# Altium schematic symbol library jlcpcb_2025_04_capacitors_extended_0603.schlib: 3668 symbols (part 6 of 20) (continued)
## 06035C333JAT2A
designator C?  Capacitance: 33nF  (hidden comment: *)
Capacitor, Ceramic (MLCC), 33nF, ±5%, 50V, X7R, ±5%, SMD 0603; Manufacturer: Kyocera AVX; Manufacturer Part Number: 06035C333JAT2A; Package Size: 0603; JLCPCB Basic Part: No; JLCPCB Part Number: C2167207; Supplier 1: LCSC; Category: Capacitors - MLCC; Supplier Part Number 1: C2167207; Tolerance: ±5%; Voltage Rating: 50V; Temperature Coefficient: X7R; RoHS: Yes; ComponentLink1Description: Datasheet; ComponentLink1URL: https://wmsc.lcsc.com/wmsc/upload/file/pdf/v2/lcsc/2304140030_Kyocera-AVX-06035C333JAT2A_C2167207.pdf; ComponentLink2Description: JLCPCB Part URL; ComponentLink2URL: https://jlcpcb.com/partdetail/C2167207; ComponentLink3Description: LCSC Part URL; ComponentLink3URL: https://lcsc.com/product-detail/Multilayer-Ceramic-Capacitors-MLCC---SMD-SMT_Kyocera-AVX-Kyocera-AVX-06035C333JAT2A_C2167207.html
footprint CAP-0603 (0603 (1608M) Capacitor)
pins: 1, 2

## 06035C392KAT2A
designator C?  Capacitance: 3.9nF  (hidden comment: *)
Capacitor, Ceramic (MLCC), 3.9nF, ±10%, 50V, X7R, ±10%, SMD 0603; Manufacturer: Kyocera AVX; Manufacturer Part Number: 06035C392KAT2A; Package Size: 0603; JLCPCB Basic Part: No; JLCPCB Part Number: C2169862; Supplier 1: LCSC; Category: Capacitors - MLCC; Supplier Part Number 1: C2169862; Tolerance: ±10%; Voltage Rating: 50V; Temperature Coefficient: X7R; RoHS: Yes; ComponentLink1Description: Datasheet; ComponentLink1URL: https://wmsc.lcsc.com/wmsc/upload/file/pdf/v2/lcsc/2304140030_Kyocera-AVX-06035C392KAT2A_C2169862.pdf; ComponentLink2Description: JLCPCB Part URL; ComponentLink2URL: https://jlcpcb.com/partdetail/C2169862; ComponentLink3Description: LCSC Part URL; ComponentLink3URL: https://lcsc.com/product-detail/Multilayer-Ceramic-Capacitors-MLCC---SMD-SMT_Kyocera-AVX-Kyocera-AVX-06035C392KAT2A_C2169862.html
footprint CAP-0603 (0603 (1608M) Capacitor)
pins: 1, 2

## 06035C471K4T2A
designator C?  Capacitance: 470pF  (hidden comment: *)
Capacitor, Ceramic (MLCC), 470pF, ±10%, 50V, X7R, ±10%, SMD 0603; Manufacturer: Kyocera AVX; Manufacturer Part Number: 06035C471K4T2A; Package Size: 0603; JLCPCB Basic Part: No; JLCPCB Part Number: C597213; Supplier 1: LCSC; Category: Capacitors - MLCC; Supplier Part Number 1: C597213; Tolerance: ±10%; Voltage Rating: 50V; Temperature Coefficient: X7R; RoHS: Yes; ComponentLink1Description: Datasheet; ComponentLink1URL: https://wmsc.lcsc.com/wmsc/upload/file/pdf/v2/lcsc/2309151023_Kyocera-AVX-06035C471K4T2A_C597213.pdf; ComponentLink2Description: JLCPCB Part URL; ComponentLink2URL: https://jlcpcb.com/partdetail/C597213; ComponentLink3Description: LCSC Part URL; ComponentLink3URL: https://lcsc.com/product-detail/Multilayer-Ceramic-Capacitors-MLCC---SMD-SMT_Kyocera-AVX-Kyocera-AVX-06035C471K4T2A_C597213.html
footprint CAP-0603 (0603 (1608M) Capacitor)
pins: 1, 2

## 06035C472K4T2A
designator C?  Capacitance: 4.7nF  (hidden comment: *)
Capacitor, Ceramic (MLCC), 4.7nF, ±10%, 50V, X7R, ±10%, SMD 0603; Manufacturer: AVX; Manufacturer Part Number: 06035C472K4T2A; Package Size: 0603; JLCPCB Basic Part: No; JLCPCB Part Number: C597214; Supplier 1: LCSC; Category: Capacitors - MLCC; Supplier Part Number 1: C597214; Tolerance: ±10%; Voltage Rating: 50V; Temperature Coefficient: X7R; RoHS: Yes; ComponentLink1Description: Datasheet; ComponentLink1URL: https://wmsc.lcsc.com/wmsc/upload/file/pdf/v2/lcsc/2304140030_Kyocera-AVX-06035C472K4T2A_C597214.pdf; ComponentLink2Description: JLCPCB Part URL; ComponentLink2URL: https://jlcpcb.com/partdetail/C597214; ComponentLink3Description: LCSC Part URL; ComponentLink3URL: https://lcsc.com/product-detail/Multilayer-Ceramic-Capacitors-MLCC---SMD-SMT_Kyocera-AVX-Kyocera-AVX-06035C472K4T2A_C597214.html
footprint CAP-0603 (0603 (1608M) Capacitor)
pins: 1, 2

## 06035C472KAT2A
designator C?  Capacitance: 4.7nF  (hidden comment: *)
Capacitor, Ceramic (MLCC), 4.7nF, ±10%, 50V, X7R, ±10%, SMD 0603; Manufacturer: AVX; Manufacturer Part Number: 06035C472KAT2A; Package Size: 0603; JLCPCB Basic Part: No; JLCPCB Part Number: C513327; Supplier 1: LCSC; Category: Capacitors - MLCC; Supplier Part Number 1: C513327; Tolerance: ±10%; Voltage Rating: 50V; Temperature Coefficient: X7R; RoHS: Yes; ComponentLink1Description: Datasheet; ComponentLink1URL: https://wmsc.lcsc.com/wmsc/upload/file/pdf/v2/lcsc/2304140030_Kyocera-AVX-06035C472KAT2A_C513327.pdf; ComponentLink2Description: JLCPCB Part URL; ComponentLink2URL: https://jlcpcb.com/partdetail/C513327; ComponentLink3Description: LCSC Part URL; ComponentLink3URL: https://lcsc.com/product-detail/Multilayer-Ceramic-Capacitors-MLCC---SMD-SMT_Kyocera-AVX-Kyocera-AVX-06035C472KAT2A_C513327.html
footprint CAP-0603 (0603 (1608M) Capacitor)
pins: 1, 2

## 06035C473K4T2A
designator C?  Capacitance: 47nF  (hidden comment: *)
Capacitor, Ceramic (MLCC), 47nF, ±10%, 50V, X7R, ±10%, SMD 0603; Manufacturer: AVX; Manufacturer Part Number: 06035C473K4T2A; Package Size: 0603; JLCPCB Basic Part: No; JLCPCB Part Number: C597217; Supplier 1: LCSC; Category: Capacitors - MLCC; Supplier Part Number 1: C597217; Tolerance: ±10%; Voltage Rating: 50V; Temperature Coefficient: X7R; RoHS: Yes; ComponentLink1Description: Datasheet; ComponentLink1URL: https://wmsc.lcsc.com/wmsc/upload/file/pdf/v2/lcsc/2304140030_Kyocera-AVX-06035C473K4T2A_C597217.pdf; ComponentLink2Description: JLCPCB Part URL; ComponentLink2URL: https://jlcpcb.com/partdetail/C597217; ComponentLink3Description: LCSC Part URL; ComponentLink3URL: https://lcsc.com/product-detail/Multilayer-Ceramic-Capacitors-MLCC---SMD-SMT_Kyocera-AVX-Kyocera-AVX-06035C473K4T2A_C597217.html
footprint CAP-0603 (0603 (1608M) Capacitor)
pins: 1, 2

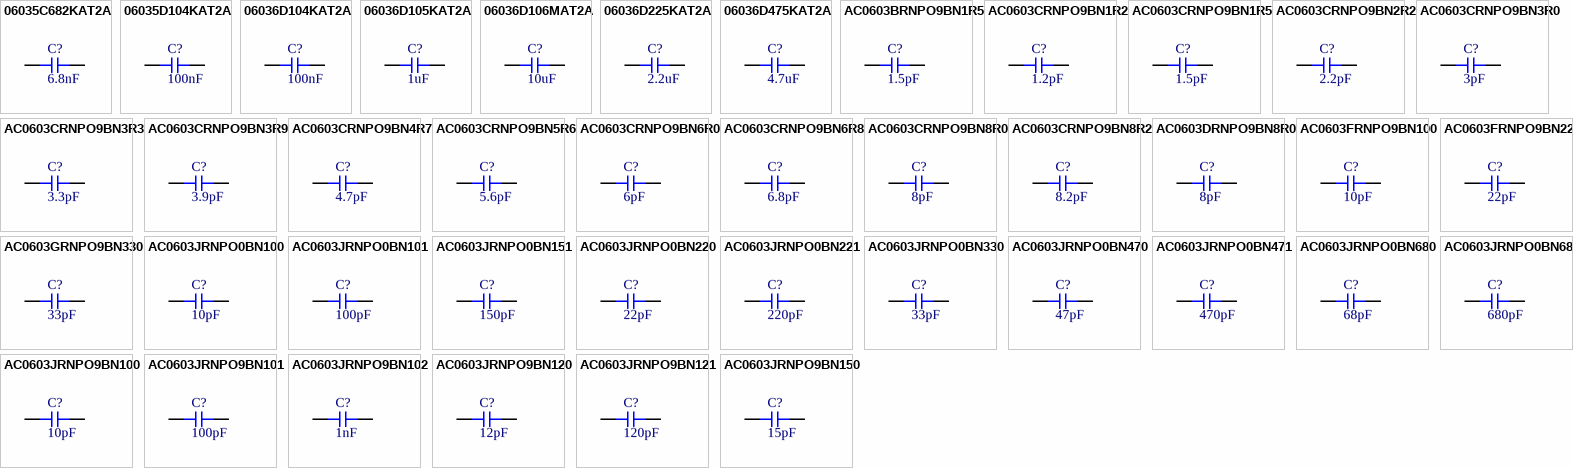
[diagram p24: symbols 06035C682KAT2A to AC0603JRNPO9BN150]

## 06035C682KAT2A
designator C?  Capacitance: 6.8nF  (hidden comment: *)
Capacitor, Ceramic (MLCC), 6.8nF, ±10%, 50V, X7R, ±10%, SMD 0603; Manufacturer: AVX; Manufacturer Part Number: 06035C682KAT2A; Package Size: 0603; JLCPCB Basic Part: No; JLCPCB Part Number: C597224; Supplier 1: LCSC; Category: Capacitors - MLCC; Supplier Part Number 1: C597224; Tolerance: ±10%; Voltage Rating: 50V; Temperature Coefficient: X7R; RoHS: Yes; ComponentLink1Description: Datasheet; ComponentLink1URL: https://wmsc.lcsc.com/wmsc/upload/file/pdf/v2/lcsc/2304140030_Kyocera-AVX-06035C682KAT2A_C597224.pdf; ComponentLink2Description: JLCPCB Part URL; ComponentLink2URL: https://jlcpcb.com/partdetail/C597224; ComponentLink3Description: LCSC Part URL; ComponentLink3URL: https://lcsc.com/product-detail/Multilayer-Ceramic-Capacitors-MLCC---SMD-SMT_Kyocera-AVX-Kyocera-AVX-06035C682KAT2A_C597224.html
footprint CAP-0603 (0603 (1608M) Capacitor)
pins: 1, 2

## 06035D104KAT2A
designator C?  Capacitance: 100nF  (hidden comment: *)
Capacitor, Ceramic (MLCC), 100nF, ±10%, 50V, X5R, ±10%, SMD 0603; Manufacturer: AVX; Manufacturer Part Number: 06035D104KAT2A; Package Size: 0603; JLCPCB Basic Part: No; JLCPCB Part Number: C597227; Supplier 1: LCSC; Category: Capacitors - MLCC; Supplier Part Number 1: C597227; Tolerance: ±10%; Voltage Rating: 50V; Temperature Coefficient: X5R; RoHS: Yes; ComponentLink1Description: Datasheet; ComponentLink1URL: https://wmsc.lcsc.com/wmsc/upload/file/pdf/v2/lcsc/2304140030_Kyocera-AVX-06035D104KAT2A_C597227.pdf; ComponentLink2Description: JLCPCB Part URL; ComponentLink2URL: https://jlcpcb.com/partdetail/C597227; ComponentLink3Description: LCSC Part URL; ComponentLink3URL: https://lcsc.com/product-detail/Multilayer-Ceramic-Capacitors-MLCC---SMD-SMT_Kyocera-AVX-Kyocera-AVX-06035D104KAT2A_C597227.html
footprint CAP-0603 (0603 (1608M) Capacitor)
pins: 1, 2

## 06036D104KAT2A
designator C?  Capacitance: 100nF  (hidden comment: *)
Capacitor, Ceramic (MLCC), 100nF, ±10%, 6.3V, X5R, ±10%, SMD 0603; Manufacturer: Kyocera AVX; Manufacturer Part Number: 06036D104KAT2A; Package Size: 0603; JLCPCB Basic Part: No; JLCPCB Part Number: C1856510; Supplier 1: LCSC; Category: Capacitors - MLCC; Supplier Part Number 1: C1856510; Tolerance: ±10%; Voltage Rating: 6.3V; Temperature Coefficient: X5R; RoHS: Yes; ComponentLink1Description: Datasheet; ComponentLink1URL: https://wmsc.lcsc.com/wmsc/upload/file/pdf/v2/lcsc/2304140030_Kyocera-AVX-06036D104KAT2A_C1856510.pdf; ComponentLink2Description: JLCPCB Part URL; ComponentLink2URL: https://jlcpcb.com/partdetail/C1856510; ComponentLink3Description: LCSC Part URL; ComponentLink3URL: https://lcsc.com/product-detail/Multilayer-Ceramic-Capacitors-MLCC---SMD-SMT_Kyocera-AVX-Kyocera-AVX-06036D104KAT2A_C1856510.html
footprint CAP-0603 (0603 (1608M) Capacitor)
pins: 1, 2

## 06036D105KAT2A
designator C?  Capacitance: 1uF  (hidden comment: *)
Capacitor, Ceramic (MLCC), 1uF, ±10%, 6.3V, X5R, ±10%, SMD 0603; Manufacturer: AVX; Manufacturer Part Number: 06036D105KAT2A; Package Size: 0603; JLCPCB Basic Part: No; JLCPCB Part Number: C597233; Supplier 1: LCSC; Category: Capacitors - MLCC; Supplier Part Number 1: C597233; Tolerance: ±10%; Voltage Rating: 6.3V; Temperature Coefficient: X5R; RoHS: Yes; ComponentLink1Description: Datasheet; ComponentLink1URL: https://wmsc.lcsc.com/wmsc/upload/file/pdf/v2/lcsc/2304140030_Kyocera-AVX-06036D105KAT2A_C597233.pdf; ComponentLink2Description: JLCPCB Part URL; ComponentLink2URL: https://jlcpcb.com/partdetail/C597233; ComponentLink3Description: LCSC Part URL; ComponentLink3URL: https://lcsc.com/product-detail/Multilayer-Ceramic-Capacitors-MLCC---SMD-SMT_Kyocera-AVX-Kyocera-AVX-06036D105KAT2A_C597233.html
footprint CAP-0603 (0603 (1608M) Capacitor)
pins: 1, 2

## 06036D106MAT2A
designator C?  Capacitance: 10uF  (hidden comment: *)
Capacitor, Ceramic (MLCC), 10uF, ±20%, 6.3V, X5R, ±20%, SMD 0603; Manufacturer: Kyocera AVX; Manufacturer Part Number: 06036D106MAT2A; Package Size: 0603; JLCPCB Basic Part: No; JLCPCB Part Number: C2167337; Supplier 1: LCSC; Category: Capacitors - MLCC; Supplier Part Number 1: C2167337; Tolerance: ±20%; Voltage Rating: 6.3V; Temperature Coefficient: X5R; RoHS: Yes; ComponentLink1Description: Datasheet; ComponentLink1URL: https://wmsc.lcsc.com/wmsc/upload/file/pdf/v2/lcsc/2304140030_Kyocera-AVX-06036D106MAT2A_C2167337.pdf; ComponentLink2Description: JLCPCB Part URL; ComponentLink2URL: https://jlcpcb.com/partdetail/C2167337; ComponentLink3Description: LCSC Part URL; ComponentLink3URL: https://lcsc.com/product-detail/Multilayer-Ceramic-Capacitors-MLCC---SMD-SMT_Kyocera-AVX-Kyocera-AVX-06036D106MAT2A_C2167337.html
footprint CAP-0603 (0603 (1608M) Capacitor)
pins: 1, 2

## 06036D225KAT2A
designator C?  Capacitance: 2.2uF  (hidden comment: *)
Capacitor, Ceramic (MLCC), 2.2uF, ±10%, 6.3V, X5R, ±10%, SMD 0603; Manufacturer: AVX; Manufacturer Part Number: 06036D225KAT2A; Package Size: 0603; JLCPCB Basic Part: No; JLCPCB Part Number: C597234; Supplier 1: LCSC; Category: Capacitors - MLCC; Supplier Part Number 1: C597234; Tolerance: ±10%; Voltage Rating: 6.3V; Temperature Coefficient: X5R; RoHS: Yes; ComponentLink1Description: Datasheet; ComponentLink1URL: https://wmsc.lcsc.com/wmsc/upload/file/pdf/v2/lcsc/2304140030_Kyocera-AVX-06036D225KAT2A_C597234.pdf; ComponentLink2Description: JLCPCB Part URL; ComponentLink2URL: https://jlcpcb.com/partdetail/C597234; ComponentLink3Description: LCSC Part URL; ComponentLink3URL: https://lcsc.com/product-detail/Multilayer-Ceramic-Capacitors-MLCC---SMD-SMT_Kyocera-AVX-Kyocera-AVX-06036D225KAT2A_C597234.html
footprint CAP-0603 (0603 (1608M) Capacitor)
pins: 1, 2

## 06036D475KAT2A
designator C?  Capacitance: 4.7uF  (hidden comment: *)
Capacitor, Ceramic (MLCC), 4.7uF, ±10%, 6.3V, X5R, ±10%, SMD 0603; Manufacturer: Kyocera AVX; Manufacturer Part Number: 06036D475KAT2A; Package Size: 0603; JLCPCB Basic Part: No; JLCPCB Part Number: C2170891; Supplier 1: LCSC; Category: Capacitors - MLCC; Supplier Part Number 1: C2170891; Tolerance: ±10%; Voltage Rating: 6.3V; Temperature Coefficient: X5R; RoHS: Yes; ComponentLink1Description: Datasheet; ComponentLink1URL: https://wmsc.lcsc.com/wmsc/upload/file/pdf/v2/lcsc/2304140030_Kyocera-AVX-06036D475KAT2A_C2170891.pdf; ComponentLink2Description: JLCPCB Part URL; ComponentLink2URL: https://jlcpcb.com/partdetail/C2170891; ComponentLink3Description: LCSC Part URL; ComponentLink3URL: https://lcsc.com/product-detail/Multilayer-Ceramic-Capacitors-MLCC---SMD-SMT_Kyocera-AVX-Kyocera-AVX-06036D475KAT2A_C2170891.html
footprint CAP-0603 (0603 (1608M) Capacitor)
pins: 1, 2

## AC0603BRNPO9BN1R5
designator C?  Capacitance: 1.5pF  (hidden comment: *)
Capacitor, Ceramic (MLCC), 1.5pF, 50V, NP0, SMD 0603; Manufacturer: YAGEO; Manufacturer Part Number: AC0603BRNPO9BN1R5; Package Size: 0603; JLCPCB Basic Part: No; JLCPCB Part Number: C605208; Supplier 1: LCSC; Category: Capacitors - MLCC; Supplier Part Number 1: C605208; Voltage Rating: 50V; Temperature Coefficient: NP0; RoHS: Yes; ComponentLink1Description: Datasheet; ComponentLink1URL: https://wmsc.lcsc.com/wmsc/upload/file/pdf/v2/lcsc/2304140030_YAGEO-AC0603BRNPO9BN1R5_C605208.pdf; ComponentLink2Description: JLCPCB Part URL; ComponentLink2URL: https://jlcpcb.com/partdetail/C605208; ComponentLink3Description: LCSC Part URL; ComponentLink3URL: https://lcsc.com/product-detail/Multilayer-Ceramic-Capacitors-MLCC---SMD-SMT_YAGEO-YAGEO-AC0603BRNPO9BN1R5_C605208.html
footprint CAP-0603 (0603 (1608M) Capacitor)
pins: 1, 2

## AC0603CRNPO9BN1R2
designator C?  Capacitance: 1.2pF  (hidden comment: *)
Capacitor, Ceramic (MLCC), 1.2pF, 50V, NP0, SMD 0603; Manufacturer: YAGEO; Manufacturer Part Number: AC0603CRNPO9BN1R2; Package Size: 0603; JLCPCB Basic Part: No; JLCPCB Part Number: C2189160; Supplier 1: LCSC; Category: Capacitors - MLCC; Supplier Part Number 1: C2189160; Voltage Rating: 50V; Temperature Coefficient: NP0; RoHS: Yes; ComponentLink1Description: Datasheet; ComponentLink1URL: https://wmsc.lcsc.com/wmsc/upload/file/pdf/v2/lcsc/2202041830_YAGEO-AC0603CRNPO9BN1R2_C2189160.pdf; ComponentLink2Description: JLCPCB Part URL; ComponentLink2URL: https://jlcpcb.com/partdetail/C2189160; ComponentLink3Description: LCSC Part URL; ComponentLink3URL: https://lcsc.com/product-detail/Multilayer-Ceramic-Capacitors-MLCC---SMD-SMT_YAGEO-YAGEO-AC0603CRNPO9BN1R2_C2189160.html
footprint CAP-0603 (0603 (1608M) Capacitor)
pins: 1, 2

## AC0603CRNPO9BN1R5
designator C?  Capacitance: 1.5pF  (hidden comment: *)
Capacitor, Ceramic (MLCC), 1.5pF, 50V, NP0, SMD 0603; Manufacturer: YAGEO; Manufacturer Part Number: AC0603CRNPO9BN1R5; Package Size: 0603; JLCPCB Basic Part: No; JLCPCB Part Number: C2189144; Supplier 1: LCSC; Category: Capacitors - MLCC; Supplier Part Number 1: C2189144; Voltage Rating: 50V; Temperature Coefficient: NP0; RoHS: Yes; ComponentLink1Description: Datasheet; ComponentLink1URL: https://wmsc.lcsc.com/wmsc/upload/file/pdf/v2/lcsc/2202041830_YAGEO-AC0603CRNPO9BN1R5_C2189144.pdf; ComponentLink2Description: JLCPCB Part URL; ComponentLink2URL: https://jlcpcb.com/partdetail/C2189144; ComponentLink3Description: LCSC Part URL; ComponentLink3URL: https://lcsc.com/product-detail/Multilayer-Ceramic-Capacitors-MLCC---SMD-SMT_YAGEO-YAGEO-AC0603CRNPO9BN1R5_C2189144.html
footprint CAP-0603 (0603 (1608M) Capacitor)
pins: 1, 2

## AC0603CRNPO9BN2R2
designator C?  Capacitance: 2.2pF  (hidden comment: *)
Capacitor, Ceramic (MLCC), 2.2pF, 50V, NP0, SMD 0603; Manufacturer: YAGEO; Manufacturer Part Number: AC0603CRNPO9BN2R2; Package Size: 0603; JLCPCB Basic Part: No; JLCPCB Part Number: C726533; Supplier 1: LCSC; Category: Capacitors - MLCC; Supplier Part Number 1: C726533; Voltage Rating: 50V; Temperature Coefficient: NP0; RoHS: Yes; ComponentLink1Description: Datasheet; ComponentLink1URL: https://wmsc.lcsc.com/wmsc/upload/file/pdf/v2/lcsc/2010041434_YAGEO-AC0603CRNPO9BN2R2_C726533.pdf; ComponentLink2Description: JLCPCB Part URL; ComponentLink2URL: https://jlcpcb.com/partdetail/C726533; ComponentLink3Description: LCSC Part URL; ComponentLink3URL: https://lcsc.com/product-detail/Multilayer-Ceramic-Capacitors-MLCC---SMD-SMT_YAGEO-YAGEO-AC0603CRNPO9BN2R2_C726533.html
footprint CAP-0603 (0603 (1608M) Capacitor)
pins: 1, 2

## AC0603CRNPO9BN3R0
designator C?  Capacitance: 3pF  (hidden comment: *)
Capacitor, Ceramic (MLCC), 3pF, 50V, NP0, SMD 0603; Manufacturer: YAGEO; Manufacturer Part Number: AC0603CRNPO9BN3R0; Package Size: 0603; JLCPCB Basic Part: No; JLCPCB Part Number: C2838741; Supplier 1: LCSC; Category: Capacitors - MLCC; Supplier Part Number 1: C2838741; Voltage Rating: 50V; Temperature Coefficient: NP0; RoHS: Yes; ComponentLink1Description: Datasheet; ComponentLink1URL: https://wmsc.lcsc.com/wmsc/upload/file/pdf/v2/lcsc/2202131930_YAGEO-AC0603CRNPO9BN3R0_C2838741.pdf; ComponentLink2Description: JLCPCB Part URL; ComponentLink2URL: https://jlcpcb.com/partdetail/C2838741; ComponentLink3Description: LCSC Part URL; ComponentLink3URL: https://lcsc.com/product-detail/Multilayer-Ceramic-Capacitors-MLCC---SMD-SMT_YAGEO-YAGEO-AC0603CRNPO9BN3R0_C2838741.html
footprint CAP-0603 (0603 (1608M) Capacitor)
pins: 1, 2

## AC0603CRNPO9BN3R3
designator C?  Capacitance: 3.3pF  (hidden comment: *)
Capacitor, Ceramic (MLCC), 3.3pF, 50V, SMD 0603; Manufacturer: YAGEO; Manufacturer Part Number: AC0603CRNPO9BN3R3; Package Size: 0603; JLCPCB Basic Part: No; JLCPCB Part Number: C726534; Supplier 1: LCSC; Category: Capacitors - MLCC; Supplier Part Number 1: C726534; Voltage Rating: 50V; RoHS: Yes; ComponentLink1Description: Datasheet; ComponentLink1URL: https://wmsc.lcsc.com/wmsc/upload/file/pdf/v2/lcsc/2012141239_YAGEO-AC0603CRNPO9BN3R3_C726534.pdf; ComponentLink2Description: JLCPCB Part URL; ComponentLink2URL: https://jlcpcb.com/partdetail/C726534; ComponentLink3Description: LCSC Part URL; ComponentLink3URL: https://lcsc.com/product-detail/Multilayer-Ceramic-Capacitors-MLCC---SMD-SMT_YAGEO-YAGEO-AC0603CRNPO9BN3R3_C726534.html
footprint CAP-0603 (0603 (1608M) Capacitor)
pins: 1, 2

## AC0603CRNPO9BN3R9
designator C?  Capacitance: 3.9pF  (hidden comment: *)
Capacitor, Ceramic (MLCC), 3.9pF, 50V, SMD 0603; Manufacturer: YAGEO; Manufacturer Part Number: AC0603CRNPO9BN3R9; Package Size: 0603; JLCPCB Basic Part: No; JLCPCB Part Number: C726535; Supplier 1: LCSC; Category: Capacitors - MLCC; Supplier Part Number 1: C726535; Voltage Rating: 50V; RoHS: Yes; ComponentLink1Description: Datasheet; ComponentLink1URL: https://wmsc.lcsc.com/wmsc/upload/file/pdf/v2/lcsc/2012141239_YAGEO-AC0603CRNPO9BN3R9_C726535.pdf; ComponentLink2Description: JLCPCB Part URL; ComponentLink2URL: https://jlcpcb.com/partdetail/C726535; ComponentLink3Description: LCSC Part URL; ComponentLink3URL: https://lcsc.com/product-detail/Multilayer-Ceramic-Capacitors-MLCC---SMD-SMT_YAGEO-YAGEO-AC0603CRNPO9BN3R9_C726535.html
footprint CAP-0603 (0603 (1608M) Capacitor)
pins: 1, 2

## AC0603CRNPO9BN4R7
designator C?  Capacitance: 4.7pF  (hidden comment: *)
Capacitor, Ceramic (MLCC), 4.7pF, 50V, NP0, SMD 0603; Manufacturer: YAGEO; Manufacturer Part Number: AC0603CRNPO9BN4R7; Package Size: 0603; JLCPCB Basic Part: No; JLCPCB Part Number: C726536; Supplier 1: LCSC; Category: Capacitors - MLCC; Supplier Part Number 1: C726536; Voltage Rating: 50V; Temperature Coefficient: NP0; RoHS: Yes; ComponentLink1Description: Datasheet; ComponentLink1URL: https://wmsc.lcsc.com/wmsc/upload/file/pdf/v2/lcsc/2011091835_YAGEO-AC0603CRNPO9BN4R7_C726536.pdf; ComponentLink2Description: JLCPCB Part URL; ComponentLink2URL: https://jlcpcb.com/partdetail/C726536; ComponentLink3Description: LCSC Part URL; ComponentLink3URL: https://lcsc.com/product-detail/Multilayer-Ceramic-Capacitors-MLCC---SMD-SMT_YAGEO-YAGEO-AC0603CRNPO9BN4R7_C726536.html
footprint CAP-0603 (0603 (1608M) Capacitor)
pins: 1, 2

## AC0603CRNPO9BN5R6
designator C?  Capacitance: 5.6pF  (hidden comment: *)
Capacitor, Ceramic (MLCC), 5.6pF, 50V, SMD 0603; Manufacturer: YAGEO; Manufacturer Part Number: AC0603CRNPO9BN5R6; Package Size: 0603; JLCPCB Basic Part: No; JLCPCB Part Number: C726537; Supplier 1: LCSC; Category: Capacitors - MLCC; Supplier Part Number 1: C726537; Voltage Rating: 50V; RoHS: Yes; ComponentLink1Description: Datasheet; ComponentLink1URL: https://wmsc.lcsc.com/wmsc/upload/file/pdf/v2/lcsc/2105241335_YAGEO-AC0603CRNPO9BN5R6_C726537.pdf; ComponentLink2Description: JLCPCB Part URL; ComponentLink2URL: https://jlcpcb.com/partdetail/C726537; ComponentLink3Description: LCSC Part URL; ComponentLink3URL: https://lcsc.com/product-detail/Multilayer-Ceramic-Capacitors-MLCC---SMD-SMT_YAGEO-YAGEO-AC0603CRNPO9BN5R6_C726537.html
footprint CAP-0603 (0603 (1608M) Capacitor)
pins: 1, 2

## AC0603CRNPO9BN6R0
designator C?  Capacitance: 6pF  (hidden comment: *)
Capacitor, Ceramic (MLCC), 6pF, 50V, NP0, SMD 0603; Manufacturer: YAGEO; Manufacturer Part Number: AC0603CRNPO9BN6R0; Package Size: 0603; JLCPCB Basic Part: No; JLCPCB Part Number: C726538; Supplier 1: LCSC; Category: Capacitors - MLCC; Supplier Part Number 1: C726538; Voltage Rating: 50V; Temperature Coefficient: NP0; RoHS: Yes; ComponentLink1Description: Datasheet; ComponentLink1URL: https://wmsc.lcsc.com/wmsc/upload/file/pdf/v2/lcsc/2009181007_YAGEO-AC0603CRNPO9BN6R0_C726538.pdf; ComponentLink2Description: JLCPCB Part URL; ComponentLink2URL: https://jlcpcb.com/partdetail/C726538; ComponentLink3Description: LCSC Part URL; ComponentLink3URL: https://lcsc.com/product-detail/Multilayer-Ceramic-Capacitors-MLCC---SMD-SMT_YAGEO-YAGEO-AC0603CRNPO9BN6R0_C726538.html
footprint CAP-0603 (0603 (1608M) Capacitor)
pins: 1, 2

## AC0603CRNPO9BN6R8
designator C?  Capacitance: 6.8pF  (hidden comment: *)
Capacitor, Ceramic (MLCC), 6.8pF, 50V, NP0, SMD 0603; Manufacturer: YAGEO; Manufacturer Part Number: AC0603CRNPO9BN6R8; Package Size: 0603; JLCPCB Basic Part: No; JLCPCB Part Number: C726539; Supplier 1: LCSC; Category: Capacitors - MLCC; Supplier Part Number 1: C726539; Voltage Rating: 50V; Temperature Coefficient: NP0; RoHS: Yes; ComponentLink1Description: Datasheet; ComponentLink1URL: https://wmsc.lcsc.com/wmsc/upload/file/pdf/v2/lcsc/2009181007_YAGEO-AC0603CRNPO9BN6R8_C726539.pdf; ComponentLink2Description: JLCPCB Part URL; ComponentLink2URL: https://jlcpcb.com/partdetail/C726539; ComponentLink3Description: LCSC Part URL; ComponentLink3URL: https://lcsc.com/product-detail/Multilayer-Ceramic-Capacitors-MLCC---SMD-SMT_YAGEO-YAGEO-AC0603CRNPO9BN6R8_C726539.html
footprint CAP-0603 (0603 (1608M) Capacitor)
pins: 1, 2

## AC0603CRNPO9BN8R0
designator C?  Capacitance: 8pF  (hidden comment: *)
Capacitor, Ceramic (MLCC), 8pF, 50V, NP0, SMD 0603; Manufacturer: YAGEO; Manufacturer Part Number: AC0603CRNPO9BN8R0; Package Size: 0603; JLCPCB Basic Part: No; JLCPCB Part Number: C726540; Supplier 1: LCSC; Category: Capacitors - MLCC; Supplier Part Number 1: C726540; Voltage Rating: 50V; Temperature Coefficient: NP0; RoHS: Yes; ComponentLink1Description: Datasheet; ComponentLink1URL: https://wmsc.lcsc.com/wmsc/upload/file/pdf/v2/lcsc/2012011712_YAGEO-AC0603CRNPO9BN8R0_C726540.pdf; ComponentLink2Description: JLCPCB Part URL; ComponentLink2URL: https://jlcpcb.com/partdetail/C726540; ComponentLink3Description: LCSC Part URL; ComponentLink3URL: https://lcsc.com/product-detail/Multilayer-Ceramic-Capacitors-MLCC---SMD-SMT_YAGEO-YAGEO-AC0603CRNPO9BN8R0_C726540.html
footprint CAP-0603 (0603 (1608M) Capacitor)
pins: 1, 2

## AC0603CRNPO9BN8R2
designator C?  Capacitance: 8.2pF  (hidden comment: *)
Capacitor, Ceramic (MLCC), 8.2pF, 50V, NP0, SMD 0603; Manufacturer: YAGEO; Manufacturer Part Number: AC0603CRNPO9BN8R2; Package Size: 0603; JLCPCB Basic Part: No; JLCPCB Part Number: C726541; Supplier 1: LCSC; Category: Capacitors - MLCC; Supplier Part Number 1: C726541; Voltage Rating: 50V; Temperature Coefficient: NP0; RoHS: Yes; ComponentLink1Description: Datasheet; ComponentLink1URL: https://wmsc.lcsc.com/wmsc/upload/file/pdf/v2/lcsc/2008281034_YAGEO-AC0603CRNPO9BN8R2_C726541.pdf; ComponentLink2Description: JLCPCB Part URL; ComponentLink2URL: https://jlcpcb.com/partdetail/C726541; ComponentLink3Description: LCSC Part URL; ComponentLink3URL: https://lcsc.com/product-detail/Multilayer-Ceramic-Capacitors-MLCC---SMD-SMT_YAGEO-YAGEO-AC0603CRNPO9BN8R2_C726541.html
footprint CAP-0603 (0603 (1608M) Capacitor)
pins: 1, 2

## AC0603DRNPO9BN8R0
designator C?  Capacitance: 8pF  (hidden comment: *)
Capacitor, Ceramic (MLCC), 8pF, 50V, SMD 0603; Manufacturer: YAGEO; Manufacturer Part Number: AC0603DRNPO9BN8R0; Package Size: 0603; JLCPCB Basic Part: No; JLCPCB Part Number: C726543; Supplier 1: LCSC; Category: Capacitors - MLCC; Supplier Part Number 1: C726543; Voltage Rating: 50V; RoHS: Yes; ComponentLink1Description: Datasheet; ComponentLink1URL: https://wmsc.lcsc.com/wmsc/upload/file/pdf/v2/lcsc/2105241335_YAGEO-AC0603DRNPO9BN8R0_C726543.pdf; ComponentLink2Description: JLCPCB Part URL; ComponentLink2URL: https://jlcpcb.com/partdetail/C726543; ComponentLink3Description: LCSC Part URL; ComponentLink3URL: https://lcsc.com/product-detail/Multilayer-Ceramic-Capacitors-MLCC---SMD-SMT_YAGEO-YAGEO-AC0603DRNPO9BN8R0_C726543.html
footprint CAP-0603 (0603 (1608M) Capacitor)
pins: 1, 2

## AC0603FRNPO9BN100
designator C?  Capacitance: 10pF  (hidden comment: *)
Capacitor, Ceramic (MLCC), 10pF, ±1%, 50V, NP0, ±1%, SMD 0603; Manufacturer: YAGEO; Manufacturer Part Number: AC0603FRNPO9BN100; Package Size: 0603; JLCPCB Basic Part: No; JLCPCB Part Number: C2241638; Supplier 1: LCSC; Category: Capacitors - MLCC; Supplier Part Number 1: C2241638; Tolerance: ±1%; Voltage Rating: 50V; Temperature Coefficient: NP0; RoHS: Yes; ComponentLink1Description: Datasheet; ComponentLink1URL: https://wmsc.lcsc.com/wmsc/upload/file/pdf/v2/lcsc/2304140030_YAGEO-AC0603FRNPO9BN100_C2241638.pdf; ComponentLink2Description: JLCPCB Part URL; ComponentLink2URL: https://jlcpcb.com/partdetail/C2241638; ComponentLink3Description: LCSC Part URL; ComponentLink3URL: https://lcsc.com/product-detail/Multilayer-Ceramic-Capacitors-MLCC---SMD-SMT_YAGEO-YAGEO-AC0603FRNPO9BN100_C2241638.html
footprint CAP-0603 (0603 (1608M) Capacitor)
pins: 1, 2

## AC0603FRNPO9BN220
designator C?  Capacitance: 22pF  (hidden comment: *)
Capacitor, Ceramic (MLCC), 22pF, ±1%, 50V, NP0, ±1%, SMD 0603; Manufacturer: YAGEO; Manufacturer Part Number: AC0603FRNPO9BN220; Package Size: 0603; JLCPCB Basic Part: No; JLCPCB Part Number: C2240294; Supplier 1: LCSC; Category: Capacitors - MLCC; Supplier Part Number 1: C2240294; Tolerance: ±1%; Voltage Rating: 50V; Temperature Coefficient: NP0; RoHS: Yes; ComponentLink1Description: Datasheet; ComponentLink1URL: https://wmsc.lcsc.com/wmsc/upload/file/pdf/v2/lcsc/2304140030_YAGEO-AC0603FRNPO9BN220_C2240294.pdf; ComponentLink2Description: JLCPCB Part URL; ComponentLink2URL: https://jlcpcb.com/partdetail/C2240294; ComponentLink3Description: LCSC Part URL; ComponentLink3URL: https://lcsc.com/product-detail/Multilayer-Ceramic-Capacitors-MLCC---SMD-SMT_YAGEO-YAGEO-AC0603FRNPO9BN220_C2240294.html
footprint CAP-0603 (0603 (1608M) Capacitor)
pins: 1, 2

## AC0603GRNPO9BN330
designator C?  Capacitance: 33pF  (hidden comment: *)
Capacitor, Ceramic (MLCC), 33pF, ±2%, 50V, NP0, ±2%, SMD 0603; Manufacturer: YAGEO; Manufacturer Part Number: AC0603GRNPO9BN330; Package Size: 0603; JLCPCB Basic Part: No; JLCPCB Part Number: C605217; Supplier 1: LCSC; Category: Capacitors - MLCC; Supplier Part Number 1: C605217; Tolerance: ±2%; Voltage Rating: 50V; Temperature Coefficient: NP0; RoHS: Yes; ComponentLink1Description: Datasheet; ComponentLink1URL: https://wmsc.lcsc.com/wmsc/upload/file/pdf/v2/lcsc/2006112335_YAGEO-AC0603GRNPO9BN330_C605217.pdf; ComponentLink2Description: JLCPCB Part URL; ComponentLink2URL: https://jlcpcb.com/partdetail/C605217; ComponentLink3Description: LCSC Part URL; ComponentLink3URL: https://lcsc.com/product-detail/Multilayer-Ceramic-Capacitors-MLCC---SMD-SMT_YAGEO-YAGEO-AC0603GRNPO9BN330_C605217.html
footprint CAP-0603 (0603 (1608M) Capacitor)
pins: 1, 2

## AC0603JRNPO0BN100
designator C?  Capacitance: 10pF  (hidden comment: *)
Capacitor, Ceramic (MLCC), 10pF, ±5%, 100V, C0G, ±5%, SMD 0603; Manufacturer: YAGEO; Manufacturer Part Number: AC0603JRNPO0BN100; Package Size: 0603; JLCPCB Basic Part: No; JLCPCB Part Number: C3831056; Supplier 1: LCSC; Category: Capacitors - MLCC; Supplier Part Number 1: C3831056; Tolerance: ±5%; Voltage Rating: 100V; Temperature Coefficient: C0G; RoHS: Yes; ComponentLink1Description: Datasheet; ComponentLink1URL: https://wmsc.lcsc.com/wmsc/upload/file/pdf/v2/lcsc/2311211113_YAGEO-AC0603JRNPO0BN100_C3831056.pdf; ComponentLink2Description: JLCPCB Part URL; ComponentLink2URL: https://jlcpcb.com/partdetail/C3831056; ComponentLink3Description: LCSC Part URL; ComponentLink3URL: https://lcsc.com/product-detail/Multilayer-Ceramic-Capacitors-MLCC---SMD-SMT_YAGEO-YAGEO-AC0603JRNPO0BN100_C3831056.html
footprint CAP-0603 (0603 (1608M) Capacitor)
pins: 1, 2

## AC0603JRNPO0BN101
designator C?  Capacitance: 100pF  (hidden comment: *)
Capacitor, Ceramic (MLCC), 100pF, ±5%, 100V, NP0, ±5%, SMD 0603; Manufacturer: YAGEO; Manufacturer Part Number: AC0603JRNPO0BN101; Package Size: 0603; JLCPCB Basic Part: No; JLCPCB Part Number: C2176690; Supplier 1: LCSC; Category: Capacitors - MLCC; Supplier Part Number 1: C2176690; Tolerance: ±5%; Voltage Rating: 100V; Temperature Coefficient: NP0; RoHS: Yes; ComponentLink1Description: Datasheet; ComponentLink1URL: https://wmsc.lcsc.com/wmsc/upload/file/pdf/v2/lcsc/2202040830_YAGEO-AC0603JRNPO0BN101_C2176690.pdf; ComponentLink2Description: JLCPCB Part URL; ComponentLink2URL: https://jlcpcb.com/partdetail/C2176690; ComponentLink3Description: LCSC Part URL; ComponentLink3URL: https://lcsc.com/product-detail/Multilayer-Ceramic-Capacitors-MLCC---SMD-SMT_YAGEO-YAGEO-AC0603JRNPO0BN101_C2176690.html
footprint CAP-0603 (0603 (1608M) Capacitor)
pins: 1, 2

## AC0603JRNPO0BN151
designator C?  Capacitance: 150pF  (hidden comment: *)
Capacitor, Ceramic (MLCC), 150pF, ±5%, 100V, NP0, ±5%, SMD 0603; Manufacturer: YAGEO; Manufacturer Part Number: AC0603JRNPO0BN151; Package Size: 0603; JLCPCB Basic Part: No; JLCPCB Part Number: C723632; Supplier 1: LCSC; Category: Capacitors - MLCC; Supplier Part Number 1: C723632; Tolerance: ±5%; Voltage Rating: 100V; Temperature Coefficient: NP0; RoHS: Yes; ComponentLink1Description: Datasheet; ComponentLink1URL: https://wmsc.lcsc.com/wmsc/upload/file/pdf/v2/lcsc/2009181808_YAGEO-AC0603JRNPO0BN151_C723632.pdf; ComponentLink2Description: JLCPCB Part URL; ComponentLink2URL: https://jlcpcb.com/partdetail/C723632; ComponentLink3Description: LCSC Part URL; ComponentLink3URL: https://lcsc.com/product-detail/Multilayer-Ceramic-Capacitors-MLCC---SMD-SMT_YAGEO-YAGEO-AC0603JRNPO0BN151_C723632.html
footprint CAP-0603 (0603 (1608M) Capacitor)
pins: 1, 2

## AC0603JRNPO0BN220
designator C?  Capacitance: 22pF  (hidden comment: *)
Capacitor, Ceramic (MLCC), 22pF, ±5%, 100V, NP0, ±5%, SMD 0603; Manufacturer: YAGEO; Manufacturer Part Number: AC0603JRNPO0BN220; Package Size: 0603; JLCPCB Basic Part: No; JLCPCB Part Number: C2176438; Supplier 1: LCSC; Category: Capacitors - MLCC; Supplier Part Number 1: C2176438; Tolerance: ±5%; Voltage Rating: 100V; Temperature Coefficient: NP0; RoHS: Yes; ComponentLink1Description: Datasheet; ComponentLink1URL: https://wmsc.lcsc.com/wmsc/upload/file/pdf/v2/lcsc/2202040830_YAGEO-AC0603JRNPO0BN220_C2176438.pdf; ComponentLink2Description: JLCPCB Part URL; ComponentLink2URL: https://jlcpcb.com/partdetail/C2176438; ComponentLink3Description: LCSC Part URL; ComponentLink3URL: https://lcsc.com/product-detail/Multilayer-Ceramic-Capacitors-MLCC---SMD-SMT_YAGEO-YAGEO-AC0603JRNPO0BN220_C2176438.html
footprint CAP-0603 (0603 (1608M) Capacitor)
pins: 1, 2

## AC0603JRNPO0BN221
designator C?  Capacitance: 220pF  (hidden comment: *)
Capacitor, Ceramic (MLCC), 220pF, ±5%, 100V, NP0, ±5%, SMD 0603; Manufacturer: YAGEO; Manufacturer Part Number: AC0603JRNPO0BN221; Package Size: 0603; JLCPCB Basic Part: No; JLCPCB Part Number: C2982813; Supplier 1: LCSC; Category: Capacitors - MLCC; Supplier Part Number 1: C2982813; Tolerance: ±5%; Voltage Rating: 100V; Temperature Coefficient: NP0; RoHS: Yes; ComponentLink1Description: Datasheet; ComponentLink1URL: https://wmsc.lcsc.com/wmsc/upload/file/pdf/v2/lcsc/2203210916_YAGEO-AC0603JRNPO0BN221_C2982813.pdf; ComponentLink2Description: JLCPCB Part URL; ComponentLink2URL: https://jlcpcb.com/partdetail/C2982813; ComponentLink3Description: LCSC Part URL; ComponentLink3URL: https://lcsc.com/product-detail/Multilayer-Ceramic-Capacitors-MLCC---SMD-SMT_YAGEO-YAGEO-AC0603JRNPO0BN221_C2982813.html
footprint CAP-0603 (0603 (1608M) Capacitor)
pins: 1, 2

## AC0603JRNPO0BN330
designator C?  Capacitance: 33pF  (hidden comment: *)
Capacitor, Ceramic (MLCC), 33pF, ±5%, 100V, NP0, ±5%, SMD 0603; Manufacturer: YAGEO; Manufacturer Part Number: AC0603JRNPO0BN330; Package Size: 0603; JLCPCB Basic Part: No; JLCPCB Part Number: C2194375; Supplier 1: LCSC; Category: Capacitors - MLCC; Supplier Part Number 1: C2194375; Tolerance: ±5%; Voltage Rating: 100V; Temperature Coefficient: NP0; RoHS: Yes; ComponentLink1Description: Datasheet; ComponentLink1URL: https://wmsc.lcsc.com/wmsc/upload/file/pdf/v2/lcsc/2304140030_YAGEO-AC0603JRNPO0BN330_C2194375.pdf; ComponentLink2Description: JLCPCB Part URL; ComponentLink2URL: https://jlcpcb.com/partdetail/C2194375; ComponentLink3Description: LCSC Part URL; ComponentLink3URL: https://lcsc.com/product-detail/Multilayer-Ceramic-Capacitors-MLCC---SMD-SMT_YAGEO-YAGEO-AC0603JRNPO0BN330_C2194375.html
footprint CAP-0603 (0603 (1608M) Capacitor)
pins: 1, 2

## AC0603JRNPO0BN470
designator C?  Capacitance: 47pF  (hidden comment: *)
Capacitor, Ceramic (MLCC), 47pF, ±5%, 100V, NP0, ±5%, SMD 0603; Manufacturer: YAGEO; Manufacturer Part Number: AC0603JRNPO0BN470; Package Size: 0603; JLCPCB Basic Part: No; JLCPCB Part Number: C389107; Supplier 1: LCSC; Category: Capacitors - MLCC; Supplier Part Number 1: C389107; Tolerance: ±5%; Voltage Rating: 100V; Temperature Coefficient: NP0; RoHS: Yes; ComponentLink1Description: Datasheet; ComponentLink1URL: https://wmsc.lcsc.com/wmsc/upload/file/pdf/v2/lcsc/1912111437_YAGEO-AC0603JRNPO0BN470_C389107.pdf; ComponentLink2Description: JLCPCB Part URL; ComponentLink2URL: https://jlcpcb.com/partdetail/C389107; ComponentLink3Description: LCSC Part URL; ComponentLink3URL: https://lcsc.com/product-detail/Multilayer-Ceramic-Capacitors-MLCC---SMD-SMT_YAGEO-YAGEO-AC0603JRNPO0BN470_C389107.html
footprint CAP-0603 (0603 (1608M) Capacitor)
pins: 1, 2

## AC0603JRNPO0BN471
designator C?  Capacitance: 470pF  (hidden comment: *)
Capacitor, Ceramic (MLCC), 470pF, ±5%, 100V, ±5%, SMD 0603; Manufacturer: YAGEO; Manufacturer Part Number: AC0603JRNPO0BN471; Package Size: 0603; JLCPCB Basic Part: No; JLCPCB Part Number: C726544; Supplier 1: LCSC; Category: Capacitors - MLCC; Supplier Part Number 1: C726544; Tolerance: ±5%; Voltage Rating: 100V; RoHS: Yes; ComponentLink1Description: Datasheet; ComponentLink1URL: https://wmsc.lcsc.com/wmsc/upload/file/pdf/v2/lcsc/2105241335_YAGEO-AC0603JRNPO0BN471_C726544.pdf; ComponentLink2Description: JLCPCB Part URL; ComponentLink2URL: https://jlcpcb.com/partdetail/C726544; ComponentLink3Description: LCSC Part URL; ComponentLink3URL: https://lcsc.com/product-detail/Multilayer-Ceramic-Capacitors-MLCC---SMD-SMT_YAGEO-YAGEO-AC0603JRNPO0BN471_C726544.html
footprint CAP-0603 (0603 (1608M) Capacitor)
pins: 1, 2

## AC0603JRNPO0BN680
designator C?  Capacitance: 68pF  (hidden comment: *)
Capacitor, Ceramic (MLCC), 68pF, ±5%, 100V, NP0, ±5%, SMD 0603; Manufacturer: YAGEO; Manufacturer Part Number: AC0603JRNPO0BN680; Package Size: 0603; JLCPCB Basic Part: No; JLCPCB Part Number: C2173498; Supplier 1: LCSC; Category: Capacitors - MLCC; Supplier Part Number 1: C2173498; Tolerance: ±5%; Voltage Rating: 100V; Temperature Coefficient: NP0; RoHS: Yes; ComponentLink1Description: Datasheet; ComponentLink1URL: https://wmsc.lcsc.com/wmsc/upload/file/pdf/v2/lcsc/2202040630_YAGEO-AC0603JRNPO0BN680_C2173498.pdf; ComponentLink2Description: JLCPCB Part URL; ComponentLink2URL: https://jlcpcb.com/partdetail/C2173498; ComponentLink3Description: LCSC Part URL; ComponentLink3URL: https://lcsc.com/product-detail/Multilayer-Ceramic-Capacitors-MLCC---SMD-SMT_YAGEO-YAGEO-AC0603JRNPO0BN680_C2173498.html
footprint CAP-0603 (0603 (1608M) Capacitor)
pins: 1, 2

## AC0603JRNPO0BN681
designator C?  Capacitance: 680pF  (hidden comment: *)
Capacitor, Ceramic (MLCC), 680pF, ±5%, 100V, NP0, ±5%, SMD 0603; Manufacturer: YAGEO; Manufacturer Part Number: AC0603JRNPO0BN681; Package Size: 0603; JLCPCB Basic Part: No; JLCPCB Part Number: C726545; Supplier 1: LCSC; Category: Capacitors - MLCC; Supplier Part Number 1: C726545; Tolerance: ±5%; Voltage Rating: 100V; Temperature Coefficient: NP0; RoHS: Yes; ComponentLink1Description: Datasheet; ComponentLink1URL: https://wmsc.lcsc.com/wmsc/upload/file/pdf/v2/lcsc/2011091835_YAGEO-AC0603JRNPO0BN681_C726545.pdf; ComponentLink2Description: JLCPCB Part URL; ComponentLink2URL: https://jlcpcb.com/partdetail/C726545; ComponentLink3Description: LCSC Part URL; ComponentLink3URL: https://lcsc.com/product-detail/Multilayer-Ceramic-Capacitors-MLCC---SMD-SMT_YAGEO-YAGEO-AC0603JRNPO0BN681_C726545.html
footprint CAP-0603 (0603 (1608M) Capacitor)
pins: 1, 2

## AC0603JRNPO9BN100
designator C?  Capacitance: 10pF  (hidden comment: *)
Capacitor, Ceramic (MLCC), 10pF, ±5%, 50V, NP0, ±5%, SMD 0603; Manufacturer: YAGEO; Manufacturer Part Number: AC0603JRNPO9BN100; Package Size: 0603; JLCPCB Basic Part: No; JLCPCB Part Number: C277527; Supplier 1: LCSC; Category: Capacitors - MLCC; Supplier Part Number 1: C277527; Tolerance: ±5%; Voltage Rating: 50V; Temperature Coefficient: NP0; RoHS: Yes; ComponentLink1Description: Datasheet; ComponentLink1URL: https://wmsc.lcsc.com/wmsc/upload/file/pdf/v2/lcsc/2304140030_YAGEO-AC0603JRNPO9BN100_C277527.pdf; ComponentLink2Description: JLCPCB Part URL; ComponentLink2URL: https://jlcpcb.com/partdetail/C277527; ComponentLink3Description: LCSC Part URL; ComponentLink3URL: https://lcsc.com/product-detail/Multilayer-Ceramic-Capacitors-MLCC---SMD-SMT_YAGEO-YAGEO-AC0603JRNPO9BN100_C277527.html
footprint CAP-0603 (0603 (1608M) Capacitor)
pins: 1, 2

## AC0603JRNPO9BN101
designator C?  Capacitance: 100pF  (hidden comment: *)
Capacitor, Ceramic (MLCC), 100pF, ±5%, 50V, NP0, ±5%, SMD 0603; Manufacturer: YAGEO; Manufacturer Part Number: AC0603JRNPO9BN101; Package Size: 0603; JLCPCB Basic Part: No; JLCPCB Part Number: C277507; Supplier 1: LCSC; Category: Capacitors - MLCC; Supplier Part Number 1: C277507; Tolerance: ±5%; Voltage Rating: 50V; Temperature Coefficient: NP0; RoHS: Yes; ComponentLink1Description: Datasheet; ComponentLink1URL: https://wmsc.lcsc.com/wmsc/upload/file/pdf/v2/lcsc/2304140030_YAGEO-AC0603JRNPO9BN101_C277507.pdf; ComponentLink2Description: JLCPCB Part URL; ComponentLink2URL: https://jlcpcb.com/partdetail/C277507; ComponentLink3Description: LCSC Part URL; ComponentLink3URL: https://lcsc.com/product-detail/Multilayer-Ceramic-Capacitors-MLCC---SMD-SMT_YAGEO-YAGEO-AC0603JRNPO9BN101_C277507.html
footprint CAP-0603 (0603 (1608M) Capacitor)
pins: 1, 2

## AC0603JRNPO9BN102
designator C?  Capacitance: 1nF  (hidden comment: *)
Capacitor, Ceramic (MLCC), 1nF, ±5%, 50V, NP0, ±5%, SMD 0603; Manufacturer: YAGEO; Manufacturer Part Number: AC0603JRNPO9BN102; Package Size: 0603; JLCPCB Basic Part: No; JLCPCB Part Number: C149612; Supplier 1: LCSC; Category: Capacitors - MLCC; Supplier Part Number 1: C149612; Tolerance: ±5%; Voltage Rating: 50V; Temperature Coefficient: NP0; RoHS: Yes; ComponentLink1Description: Datasheet; ComponentLink1URL: https://wmsc.lcsc.com/wmsc/upload/file/pdf/v2/lcsc/2304140030_YAGEO-AC0603JRNPO9BN102_C149612.pdf; ComponentLink2Description: JLCPCB Part URL; ComponentLink2URL: https://jlcpcb.com/partdetail/C149612; ComponentLink3Description: LCSC Part URL; ComponentLink3URL: https://lcsc.com/product-detail/Multilayer-Ceramic-Capacitors-MLCC---SMD-SMT_YAGEO-YAGEO-AC0603JRNPO9BN102_C149612.html
footprint CAP-0603 (0603 (1608M) Capacitor)
pins: 1, 2

## AC0603JRNPO9BN120
designator C?  Capacitance: 12pF  (hidden comment: *)
Capacitor, Ceramic (MLCC), 12pF, ±5%, 50V, NP0, ±5%, SMD 0603; Manufacturer: YAGEO; Manufacturer Part Number: AC0603JRNPO9BN120; Package Size: 0603; JLCPCB Basic Part: No; JLCPCB Part Number: C149617; Supplier 1: LCSC; Category: Capacitors - MLCC; Supplier Part Number 1: C149617; Tolerance: ±5%; Voltage Rating: 50V; Temperature Coefficient: NP0; RoHS: Yes; ComponentLink1Description: Datasheet; ComponentLink1URL: https://wmsc.lcsc.com/wmsc/upload/file/pdf/v2/lcsc/1811082120_YAGEO-AC0603JRNPO9BN120_C149617.pdf; ComponentLink2Description: JLCPCB Part URL; ComponentLink2URL: https://jlcpcb.com/partdetail/C149617; ComponentLink3Description: LCSC Part URL; ComponentLink3URL: https://lcsc.com/product-detail/Multilayer-Ceramic-Capacitors-MLCC---SMD-SMT_YAGEO-YAGEO-AC0603JRNPO9BN120_C149617.html
footprint CAP-0603 (0603 (1608M) Capacitor)
pins: 1, 2

## AC0603JRNPO9BN121
designator C?  Capacitance: 120pF  (hidden comment: *)
Capacitor, Ceramic (MLCC), 120pF, ±5%, 50V, NP0, ±5%, SMD 0603; Manufacturer: YAGEO; Manufacturer Part Number: AC0603JRNPO9BN121; Package Size: 0603; JLCPCB Basic Part: No; JLCPCB Part Number: C2194838; Supplier 1: LCSC; Category: Capacitors - MLCC; Supplier Part Number 1: C2194838; Tolerance: ±5%; Voltage Rating: 50V; Temperature Coefficient: NP0; RoHS: Yes; ComponentLink1Description: Datasheet; ComponentLink1URL: https://wmsc.lcsc.com/wmsc/upload/file/pdf/v2/lcsc/2304140030_YAGEO-AC0603JRNPO9BN121_C2194838.pdf; ComponentLink2Description: JLCPCB Part URL; ComponentLink2URL: https://jlcpcb.com/partdetail/C2194838; ComponentLink3Description: LCSC Part URL; ComponentLink3URL: https://lcsc.com/product-detail/Multilayer-Ceramic-Capacitors-MLCC---SMD-SMT_YAGEO-YAGEO-AC0603JRNPO9BN121_C2194838.html
footprint CAP-0603 (0603 (1608M) Capacitor)
pins: 1, 2

## AC0603JRNPO9BN150
designator C?  Capacitance: 15pF  (hidden comment: *)
Capacitor, Ceramic (MLCC), 15pF, ±5%, 50V, NP0, ±5%, SMD 0603; Manufacturer: YAGEO; Manufacturer Part Number: AC0603JRNPO9BN150; Package Size: 0603; JLCPCB Basic Part: No; JLCPCB Part Number: C2180165; Supplier 1: LCSC; Category: Capacitors - MLCC; Supplier Part Number 1: C2180165; Tolerance: ±5%; Voltage Rating: 50V; Temperature Coefficient: NP0; RoHS: Yes; ComponentLink1Description: Datasheet; ComponentLink1URL: https://wmsc.lcsc.com/wmsc/upload/file/pdf/v2/lcsc/2202041100_YAGEO-AC0603JRNPO9BN150_C2180165.pdf; ComponentLink2Description: JLCPCB Part URL; ComponentLink2URL: https://jlcpcb.com/partdetail/C2180165; ComponentLink3Description: LCSC Part URL; ComponentLink3URL: https://lcsc.com/product-detail/Multilayer-Ceramic-Capacitors-MLCC---SMD-SMT_YAGEO-YAGEO-AC0603JRNPO9BN150_C2180165.html
footprint CAP-0603 (0603 (1608M) Capacitor)
pins: 1, 2

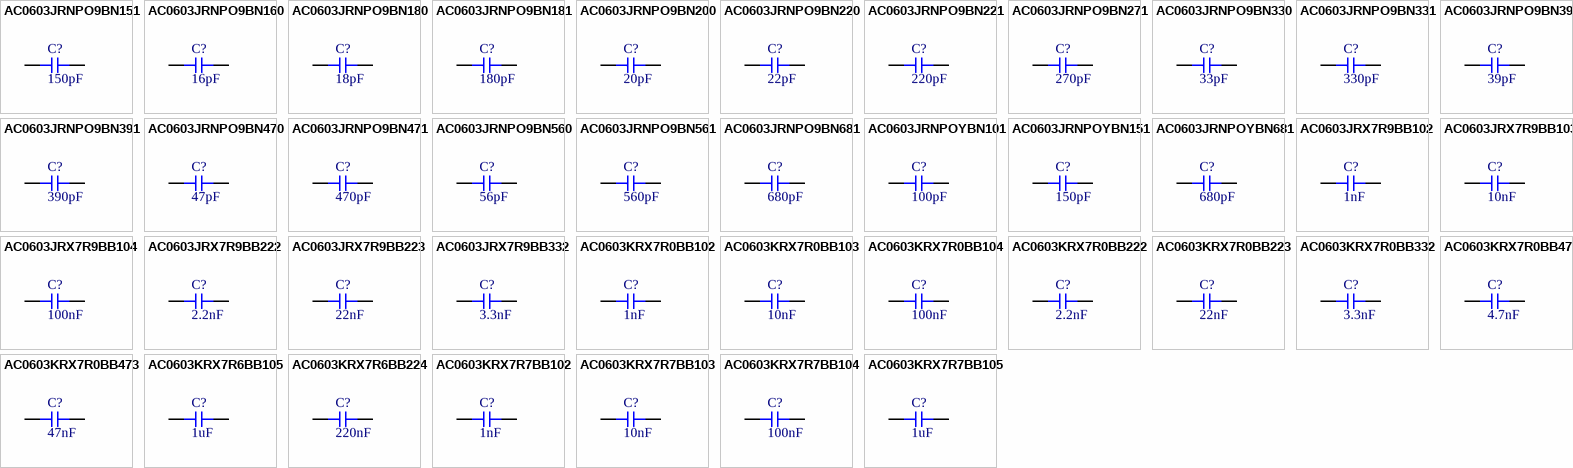
[diagram p25: symbols AC0603JRNPO9BN151 to AC0603KRX7R7BB105]
